# Altium schematic symbol library BARKO_SCHLIB.SchLib: 1064 symbols (part 6 of 11) (continued)
## IC-STM32F072CBT6 (continued)
IC MCU 32BIT 128KB FLASH 48LQFP; Manufacturer: STMicroelectronics; Manufacturer Part Number: STM32F072CBT6TR; Packing: Tray; I/Os (High Current): 37; Core: ARM Cortex-M0; Operating Frequency(F) (Processor speed) (MHz): 48; FLASH Size (Prog) (kB): 128; Internal RAM Size (kB): 16; D/A Converter: 1; Supply Voltage(Vcc) min (V): 2; RAM Size: 16KB; Max Power Dissipation: 370mW; Interface: I2C,SPI,USB,CAN,HDMI,IrDA,UART,USART,LIN,I2S; Number of Timers/Counters: 9; Frequency: 48MHz; Oscillator Type: Internal; Data Bus Width: 32b; Watchdog Timer: Yes; Peripherals: POR,PWM,WDT,DMA; Min Supply Voltage: 2V; Max Supply Voltage: 3.6V; Core Architecture: ARM; Washability: OK; .Creator: M.OZKAN; .PCBCHK: USED; ComponentLink2URL: http://www.st.com/st-web-ui/static/active/en/resource/technical/document/datasheet/DM00090510.pdf; DatasheetVersion: Rev. 5; ComponentLink2Description: Datasheet; Package Reference: LQFP48; PartNumber: STM32F072CBT6; ComponentLink1Description: Manufacturer URL; Package Description: 48-Pin Low Profile Quad Flat Package, Body 7 x 7 mm, Pitch 0.5 mm; ComponentLink1URL: http://www.st.com/; Mounting Technology: Surface Mount; Supplier 1: Digi-Key; Stock 1: 1407; Pricing 1: 1=3.94000, 10=3.53500, 100=2.89650, 500=2.46570, 1000=2.07950 (USD); RoHS: Yes; Mount: Surface Mount; Case/Package: LQFP; Number of Pins: 48; Min Operating Temperature: -40°C; Max Operating Temperature: 85°C; Packaging: Tape and Reel; Number of I/Os: 37; Number of Programmable I/O: 37; Max Frequency: 48MHz; Memory Type: FLASH; Memory Size: 128KB; Package Quantity: 2400; Lead Free: Lead Free; ComponentLink3URL: https://datasheet.ciiva.com/48492/dm00090510-48492505.pdf?src-supplier=Avnet; ComponentLink3Description: https://datasheet.ciiva.com/48492/dm00090510-48492505.pdf?src-supplier=Avnet; Supplier Part Number 1: 497-18747-1-ND; .SCHCHK: USED
footprint STM-LQFP48_M (QFP, 48-Leads, Body 7x7mm, Pitch 0.5mm, IPC Low Density)
pins: 1 VBAT (power) "Backup power supply", 2 PC13-WKUP2, RTC_TAMP1, RTC_TS, RTC_OUT (io) "PC13/WKUP2,RTC_TAMP1,RTC_TS,RTC_OUT", 3 PC14-OSC32_IN(PC14) (io) "PC14-OSC32_IN(PC14)/OSC32_IN", 4 PC15-OSC32_OUT(PC15) (io) "PC15-OSC32_OUT(PC15)/OSC_OUT", 5 PF0-OSC_IN(PF0) (io) "PF0-OSC_IN(PF0)/CRS_SYNC/OSC_IN", 6 PF1-OSC_OUT(PF1) (io) "PF1-OSC_OUT(PF1)/OSC_OUT", 7 NRST (io) "Device reset input/internal reset output(active low)", 8 VSSA (power) "Analog ground", 9 VDDA (power) "Analog power supply", 10 PA0-USART2_CTS, TIM2_CH1_ETR, COMP1_OUT, TSC_G1_IO1, USART4_TX (io) "PA0/USART2_CTS,TIM2_CH1_ETR,COMP1_OUT,TSC_G1_IO1,USART4_TX/RTC_TAMP2,WKUP1,ADC_IN0,COMP1_INM6", 11 PA1-USART2_RTS, TIM2_CH2, TIM15_CH1N, TSC_G1_IO2, USART4_RX, EVENTOUT (io) "PA1/USART2_RTS,TIM2_CH2,TIM15_CH1N,TSC_G1_IO2,USART4_RX,EVENTOUT/ADC_IN1,COMP1_INP", 12 PA2-USART2_TX, COMP2_OUT, TIM2_CH3, TIM15_CH1, TSC_G1_IO3 (io) "PA2/USART2_TX,COMP2_OUT,TIM2_CH3,TIM15_CH1,TSC_G1_IO3/ADC_IN2,COMP2_INM6,WKUP4", 13 PA3-USART2_RX,TIM2_CH4, TIM15_CH2, TSC_G1_IO4 (io) "PA3/USART2_RX,TIM2_CH4,TIM15_CH2,TSC_G1_IO4/ADC_IN3,COMP2_INP", 14 PA4-SPI1_NSS, I2S1_WS, TIM14_CH1, TSC_G2_IO1, USART2_CK (io) "PA4/SPI1_NSS,I2S1_WS,TIM14_CH1,TSC_G2_IO1,USART2_CK/COMP1_INM4,COMP2_INM4,ADC_IN4,DAC_OUT1", 15 PA5-SPI1_SCK, I2S1_CK, CEC, TIM2_CH1_ETR, TSC_G2_IO2 (io) "PA5/SPI1_SCK,I2S1_CK,CEC,TIM2_CH1_ETR,TSC_G2_IO2/COMP1_INM5,COMP2_INM5,ADC_IN5,DAC_OUT2", 16 PA6-SPI1_MISO, I2S1_MCK, TIM3_CH1, TIM1_BKIN, TIM16_CH1, COMP1_OUT, TSC_G2_IO3, EVENTOUT, USART3_CTS (io) "PA6/SPI1_MISO,I2S1_MCK,TIM3_CH1,TIM1_BKIN,TIM16_CH1,COMP1_OUT,TSC_G2_IO3,EVENTOUT,USART3_CTS/ADC_IN6", 17 PA7-SPI1_MOSI, I2S1_SD, TIM3_CH2, TIM14_CH1, TIM1_CH1N, TIM17_CH1, COMP2_OUT, TSC_G2_IO4, EVENTOUT (io) "PA7/SPI1_MOSI,I2S1_SD,TIM3_CH2,TIM14_CH1,TIM1_CH1N,TIM17_CH1,COMP2_OUT,TSC_G2_IO4,EVENTOUT/ADC_IN7", 18 PB0-TIM3_CH3, TIM1_CH2N, TSC_G3_IO2, EVENTOUT, USART3_CK (io) "PB0/TIM3_CH3,TIM1_CH2N,TSC_G3_IO2,EVENTOUT,USART3_CK/ADC_IN8", 19 PB1-TIM3_CH4, USART3_RTS, TIM14_CH1, TIM1_CH3N, TSC_G3_IO3 (io) "PB1/TIM3_CH4,USART3_RTS,TIM14_CH1,TIM1_CH3N,TSC_G3_IO3/ADC_IN9", 20 PB2-TSC_G3_IO4 (io) "PB2/TSC_G3_IO4", 21 PB10-SPI2_SCK, I2C2_SCL, USART3_TX, CEC, TSC_SYNC, TIM2_CH3 (io) "PB10/SPI2_SCK,I2C2_SCL,USART3_TX,CEC,TSC_SYNC,TIM2_CH3", 22 PB11-USART3_RX, TIM2_CH4, EVENTOUT, TSC_G6_IO1, I2C2_SDA (io) "PB11/USART3_RX,TIM2_CH4,EVENTOUT,TSC_G6_IO1,I2C2_SDA", 23 VSS (power) "Ground", 24 VDD (power) "Digital power supply", 25 PB12-TIM1_BKIN, TIM15_BKIN, SPI2_NSS, I2S2_WS, USART3_CK, TSC_G6_IO2, EVENTOUT (io) "PB12/TIM1_BKIN,TIM15_BKIN,SPI2_NSS,I2S2_WS,USART3_CK,TSC_G6_IO2,EVENTOUT", 26 PB13-SPI2_SCK, I2S2_CK, I2C2_SCL, USART3_CTS, TIM1_CH1N, TSC_G6_IO3 (io) "PB13/SPI2_SCK,I2S2_CK,I2C2_SCL,USART3_CTS,TIM1_CH1N,TSC_G6_IO3", 27 PB14-SPI2_MISO, I2S2_MCK, I2C2_SDA, USART3_RTS, TIM1_CH2N, TIM15_CH1, TSC_G6_IO4 (io) "PB14/SPI2_MISO,I2S2_MCK,I2C2_SDA,USART3_RTS,TIM1_CH2N,TIM15_CH1,TSC_G6_IO4", 28 PB15-SPI2_MOSI, I2S2_SD, TIM1_CH3N, TIM15_CH1N, TIM15_CH2 (io) "PB15/SPI2_MOSI,I2S2_SD,TIM1_CH3N,TIM15_CH1N,TIM15_CH2/WKUP7,RTC_REFIN", 29 PA8-USART1_CK, TIM1_CH1, EVENTOUT, MCO, CRS_SYNC (io) "PA8/USART1_CK,TIM1_CH1,EVENTOUT,MCO,CRS_SYNC", 30 PA9-USART1_TX, TIM1_CH2, TIM15_BKIN, TSC_G4_IO1 (io) "PA9/USART1_TX,TIM1_CH2,TIM15_BKIN,TSC_G4_IO1", 31 PA10-USART1_RX, TIM1_CH3, TIM17_BKIN, TSC_G4_IO2 (io) "PA10/USART1_RX,TIM1_CH3,TIM17_BKIN,TSC_G4_IO2", 32 PA11-CAN_RX, USART1_CTS, TIM1_CH4, COMP1_OUT, TSC_G4_IO3, EVENTOUT (io) "PA11/CAN_RX,USART1_CTS,TIM1_CH4,COMP1_OUT,TSC_G4_IO3,EVENTOUT/USB_DM", 33 PA12-CAN_TX, USART1_RTS, TIM1_ETR, COMP2_OUT, TSC_G4_IO4, EVENTOUT (io) "PA12/CAN_TX,USART1_RTS,TIM1_ETR,COMP2_OUT,TSC_G4_IO4,EVENTOUT/USB_DP", 34 PA13-IR_OUT, SWDIO, USB_NOE (io) "PA13/IR_OUT,SWDIO,USB_NOE", 35 VSS (power) "Ground", 36 VDDIO2 (power) "Digital power supply", 37 PA14-USART2_TX, SWCLK (io) "PA14/USART2_TX,SWCLK", 38 PA15-SPI1_NSS, I2S1_WS, USART2_RX, USART4_RTS, TIM2_CH1_ETR, EVENTOUT (io) "PA15/SPI1_NSS,I2S1_WS,USART2_RX,USART4_RTS,TIM2_CH1_ETR,EVENTOUT", 39 PB3-SPI1_SCK, I2S1_CK, TIM2_CH2, TSC_G5_IO1, EVENTOUT (io) "PB3/SPI1_SCK,I2S1_CK,TIM2_CH2,TSC_G5_IO1,EVENTOUT", 40 PB4-SPI1_MISO, I2S1_MCK, TIM17_BKIN, TIM3_CH1, TSC_G5_IO2, EVENTOUT  (io) "PB4/SPI1_MISO,I2S1_MCK,TIM17_BKIN,TIM3_CH1,TSC_G5_IO2,EVENTOUT", 41 PB5-SPI1_MOSI, I2S1_SD, I2C1_SMBA, TIM16_BKIN, TIM3_CH2  (io) "PB5/SPI1_MOSI,I2S1_SD,I2C1_SMBA,TIM16_BKIN,TIM3_CH2/WKUP6", 42 PB6-I2C1_SCL, USART1_TX, TIM16_CH1N, TSC_G5_I03 (io) "PB6/I2C1_SCL,USART1_TX,TIM16_CH1N,TSC_G5_IO3", 43 PB7-I2C1_SDA, USART1_RX, USART4_CTS, TIM17_CH1N, TSC_G5_IO4 (io) "PB7/I2C1_SDA,USART1_RX,USART4_CTS,TIM17_CH1N,TSC_G5_IO4", 44 BOOT0 (in) "Boot memory selection", 45 PB8-I2C1_SCL, CEC, TIM16_CH1, TSC_SYNC, CAN_RX (io) "PB8/I2C1_SCL,CEC,TIM16_CH1,TSC_SYNC,CAN_RX", 46 PB9-SPI2_NSS, I2S2_WS, I2C1_SDA, IR_OUT, TIM17_CH1, EVENTOUT, CAN_TX (io) "PB9/SPI2_NSS,I2S2_WS,I2C1_SDA,IR_OUT,TIM17_CH1,EVENTOUT,CAN_TX", 47 VSS (power) "Ground", 48 VDD (power) "Digital power supply"

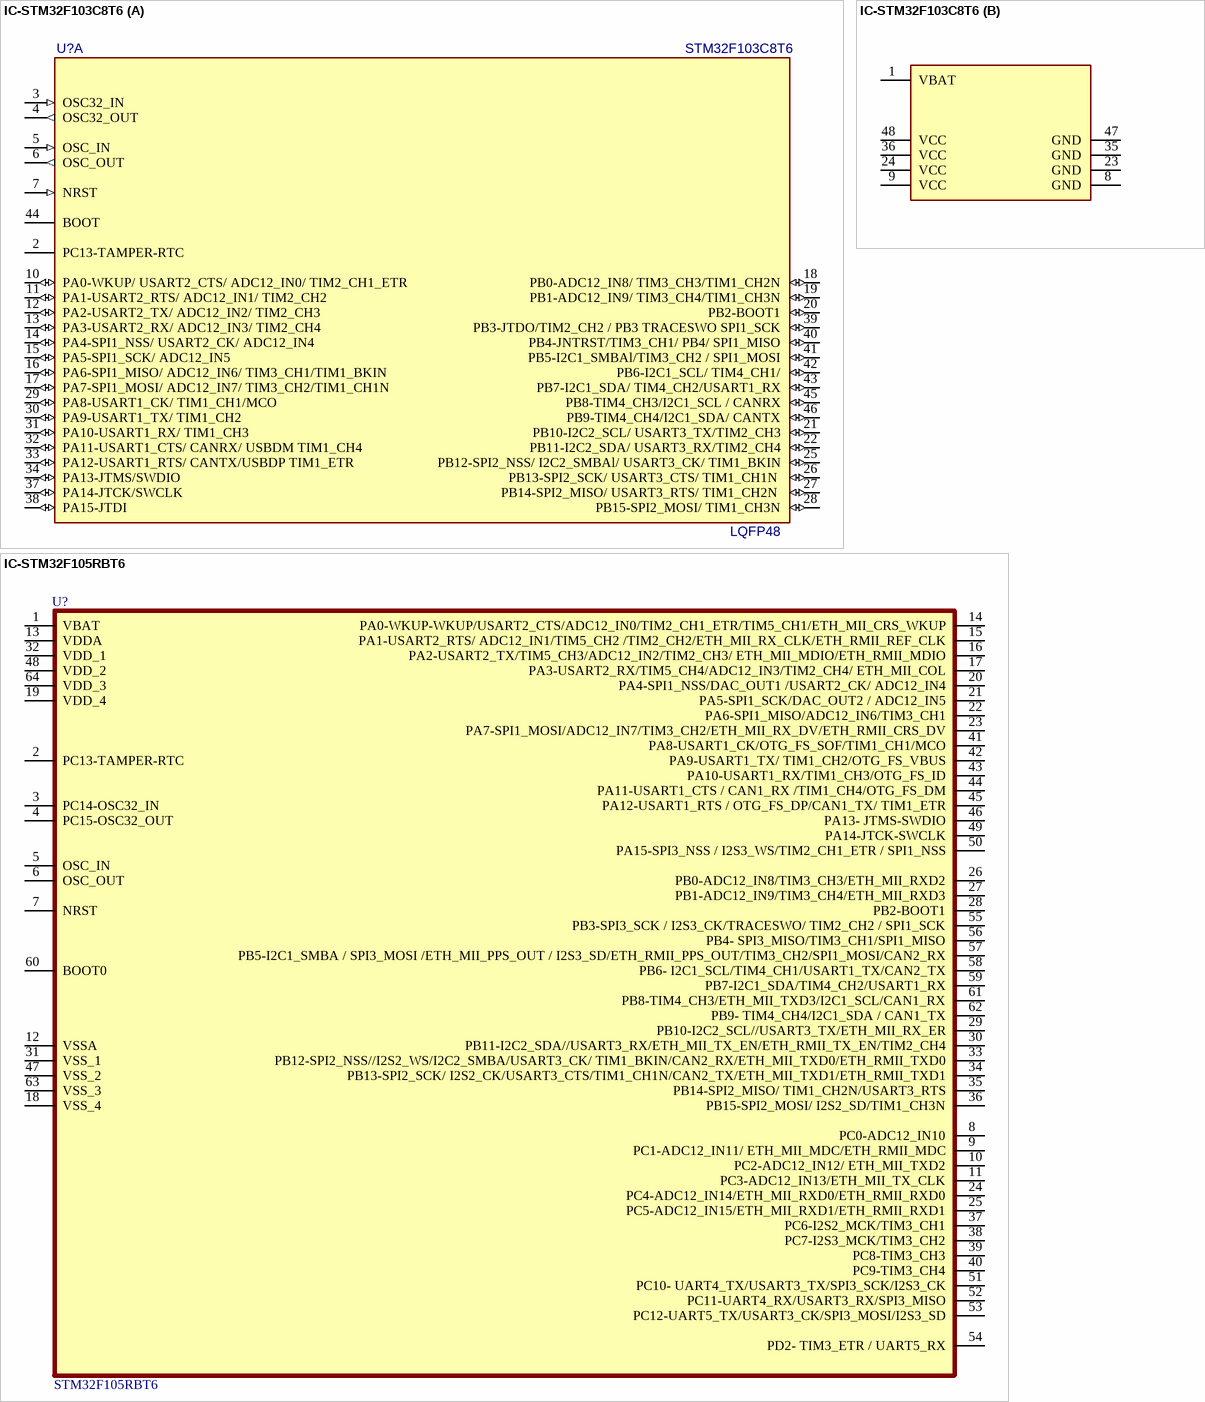
[diagram p23: symbols IC-STM32F103C8T6 to IC-STM32F105RBT6]

## IC-STM32F103C8T6
designator U?, comment STM32F103C8T6  Case/Package: LQFP48
IC MCU 32BIT 64KB FLASH 48LQFP; Manufacturer: STMicroelectronics; RAM Size: 20KB; Frequency: 72MHz; Number of Timers/Counters: 4; Number of ADC Channels: 10; Data Bus Width: 32b; Number of Bits: 32; Core Architecture: ARM; Max Power Dissipation: 363mW; Interface: CAN,I2C,IrDA,LIN,SPI,UART,USART,USB; Number of I/Os: 37; Max Supply Voltage: 3.6V; Min Supply Voltage: 2V; Oscillator Type: Internal; Number of Programmable I/O: 48; Number of SPI Channels: 2; Watchdog Timer: Yes; Peripherals: DMA,I2C,POR,PWM,Temp Sensor,WDT; Number of PWM Channels: 1; .PCBCHK: USED; .Creator: F:TALI; Washability: OK; Supplier 1: Digi-Key; Manufacturer Part Number: STM32F103C8T6; Stock 1: 3996; Pricing 1: 1=6.06, 10=5.438, 250=4.22724, 500=3.7931, 1000=3.199 (USD); Number of Pins: 48; Min Operating Temperature: -40°C; Max Operating Temperature: 85°C; Packaging: Tray; Density: 64KB; Memory Type: FLASH; Max Frequency: 72MHz; Memory Size: 64KB; Package Quantity: 250; Number of I2C Channels: 2; Termination: SMD/SMT; Address Bus Width: 32b; Length: 7mm; Height: 1.45mm; Width: 7.2mm; Radiation Hardening: No; Lead Free: Lead Free; REACH SVHC: No SVHC; ComponentLink1URL: http://www.st.com/web/en/resource/technical/document/datasheet/CD00161566.pdf; ComponentLink1Description: http://www.st.com/web/en/resource/technical/document/datasheet/CD00161566.pdf; ComponentLink2URL: https://www.distrelec.biz/Web/Downloads/3_/en/puSTM_ARM-MicroCont-STM32F103_EN.pdf?mime=application%2Fpdf; ComponentLink2Description: https://www.distrelec.biz/Web/Downloads/3_/en/puSTM_ARM-MicroCont-STM32F103_EN.pdf?mime=application%2Fpdf; ComponentLink3URL: https://www.verical.com/server-webapp/html/getDatasheet?partID=69880; ComponentLink3Description: https://www.verical.com/server-webapp/html/getDatasheet?partID=69880; ComponentLink4URL: http://www.farnell.com/datasheets/1730126.pdf; ComponentLink4Description: http://www.farnell.com/datasheets/1730126.pdf; ComponentLink5URL: http://www.produktinfo.conrad.com/datenblaetter/1000000-1099999/001075658-da-01-en-MCU_64KB_MEM_STM32F103C8T6_LQFP_48_STM.pdf; ComponentLink5Description: http://www.produktinfo.conrad.com/datenblaetter/1000000-1099999/001075658-da-01-en-MCU_64KB_MEM_STM32F103C8T6_LQFP_48_STM.pdf; ComponentLink6URL: http://datasheet.iiic.cc/stmicroelectronics/STM32F103C8T6.pdf; ComponentLink6Description: http://datasheet.iiic.cc/stmicroelectronics/STM32F103C8T6.pdf; Supplier Part Number 1: 497-6063-ND; .SCHCHK: USED
footprint LQFP_48
footprint STM-LQFP48_M (QFP, 48-Leads, Body 7x7mm, Pitch 0.5mm, IPC Low Density)
part A pins: 2 PC13-TAMPER-RTC, 3 OSC32_IN (in), 4 OSC32_OUT (out), 5 OSC_IN (in), 6 OSC_OUT (out), 7 NRST (in), 10 PA0-WKUP/ USART2_CTS/ ADC12_IN0/ TIM2_CH1_ETR (io), 11 PA1-USART2_RTS/ ADC12_IN1/ TIM2_CH2 (io), 12 PA2-USART2_TX/ ADC12_IN2/ TIM2_CH3 (io), 13 PA3-USART2_RX/ ADC12_IN3/ TIM2_CH4 (io), 14 PA4-SPI1_NSS/ USART2_CK/ ADC12_IN4  (io), 15 PA5-SPI1_SCK/ ADC12_IN5  (io), 16 PA6-SPI1_MISO/ ADC12_IN6/ TIM3_CH1/TIM1_BKIN (io), 17 PA7-SPI1_MOSI/ ADC12_IN7/ TIM3_CH2/TIM1_CH1N (io), 18 PB0-ADC12_IN8/ TIM3_CH3/TIM1_CH2N (io), 19 PB1-ADC12_IN9/ TIM3_CH4/TIM1_CH3N (io), 20 PB2-BOOT1 (io), 21 PB10-I2C2_SCL/ USART3_TX/TIM2_CH3 (io), 22 PB11-I2C2_SDA/ USART3_RX/TIM2_CH4 (io), 25 PB12-SPI2_NSS/ I2C2_SMBAl/ USART3_CK/ TIM1_BKIN (io), 26 PB13-SPI2_SCK/ USART3_CTS/ TIM1_CH1N  (io), 27 PB14-SPI2_MISO/ USART3_RTS/ TIM1_CH2N  (io), 28 PB15-SPI2_MOSI/ TIM1_CH3N (io), 29 PA8-USART1_CK/ TIM1_CH1/MCO (io), 30 PA9-USART1_TX/ TIM1_CH2 (io), 31 PA10-USART1_RX/ TIM1_CH3 (io), 32 PA11-USART1_CTS/ CANRX/ USBDM TIM1_CH4 (io), 33 PA12-USART1_RTS/ CANTX/USBDP TIM1_ETR (io), 34 PA13-JTMS/SWDIO  (io), 37 PA14-JTCK/SWCLK  (io), 38 PA15-JTDI (io), 39 PB3-JTDO/TIM2_CH2 / PB3 TRACESWO SPI1_SCK (io), 40 PB4-JNTRST/TIM3_CH1/ PB4/ SPI1_MISO (io), 41 PB5-I2C1_SMBAl/TIM3_CH2 / SPI1_MOSI (io), 42 PB6-I2C1_SCL/ TIM4_CH1/ (io), 43 PB7-I2C1_SDA/ TIM4_CH2/USART1_RX (io), 44 BOOT, 45 PB8-TIM4_CH3/I2C1_SCL / CANRX (io), 46 PB9-TIM4_CH4/I2C1_SDA/ CANTX (io)
part B pins: 1 VBAT, 8 GND (power), 9 VCC (power), 23 GND (power), 24 VCC (power), 35 GND (power), 36 VCC (power), 47 GND (power), 48 VCC (power)

## IC-STM32F105RBT6
designator U?, comment STM32F105RBT6
IC MCU 32BIT 128KB FLASH 64LQFP; Manufacturer: STMicroelectronics; Interface: CAN,I2C,I2S,IrDA,LIN,SPI,UART,USART,USB; Number of Timers/Counters: 7; Frequency: 72MHz; RAM Size: 32KB; Max Supply Voltage: 3.6V; Number of I/Os: 51; Max Power Dissipation: 444mW; Min Supply Voltage: 2V; Data Bus Width: 32b; Oscillator Type: Internal; Watchdog Timer: Yes; Peripherals: DMA,I2C,POR,PWM,Voltage Detect,WDT; Core Architecture: ARM; Number of PWM Channels: 16; Number of SPI Channels: 3; Number of I2C Channels: 2; .Creator: F:TALI; .PCBCHK: USED; Washability: OK; Supplier 1: Digi-Key; Manufacturer Part Number: STM32F105RBT6; Stock 1: 7453; Pricing 1: 1=7.14, 10=6.45, 160=5.34, 640=4.65, 1120=4.05 (USD); Number of Pins: 64; Min Operating Temperature: -40°C; Max Operating Temperature: 85°C; Package Quantity: 160; Packaging: Tray; Number of Programmable I/O: 51; Max Frequency: 72MHz; Memory Type: FLASH; Memory Size: 128KB; Number of ADC Channels: 16; Density: 128KB; Termination: SMD/SMT; Length: 10mm; Height: 1.45mm; Width: 10mm; Radiation Hardening: No; Lead Free: Lead Free; REACH SVHC: No SVHC; ComponentLink1URL: http://www.farnell.com/datasheets/1805458.pdf?src-supplier=Element14; ComponentLink1Description: http://www.farnell.com/datasheets/1805458.pdf?src-supplier=Element14; ComponentLink2URL: https://www.verical.com/server-webapp/html/getDatasheet?partID=113902&src-supplier=Verical; ComponentLink2Description: https://www.verical.com/server-webapp/html/getDatasheet?partID=113902&src-supplier=Verical; ComponentLink3URL: http://www.produktinfo.conrad.com/datenblaetter/1000000-1099999/001075692-da-01-en-MCU_128KB_MEM_STM32F105RBT6_LQFP_64_STM.pdf?src-supplier=Conrad; ComponentLink3Description: http://www.produktinfo.conrad.com/datenblaetter/1000000-1099999/001075692-da-01-en-MCU_128KB_MEM_STM32F105RBT6_LQFP_64_STM.pdf?src-supplier=Conrad; ComponentLink4URL: http://datasheet.iiic.cc/stmicroelectronics/STM32F105RBT6.pdf?src-supplier=IIIC; ComponentLink4Description: http://datasheet.iiic.cc/stmicroelectronics/STM32F105RBT6.pdf?src-supplier=IIIC; Supplier Part Number 1: 497-8920-ND; .SCHCHK: USED; Case/Package: LQFP64
footprint STM-LQFP64_V (Thin QFP, 64-Leads, Body 10x10mm, Pitch 0.5mm, ST Recommended)
pins: 1 VBAT, 2 PC13-TAMPER-RTC, 3 PC14-OSC32_IN, 4 PC15-OSC32_OUT, 5 OSC_IN, 6 OSC_OUT, 7 NRST, 8 PC0-ADC12_IN10, 9 PC1-ADC12_IN11/ ETH_MII_MDC/ETH_RMII_MDC, 10 PC2-ADC12_IN12/ ETH_MII_TXD2, 11 PC3-ADC12_IN13/ETH_MII_TX_CLK, 12 VSSA, 13 VDDA, 14 PA0-WKUP-WKUP/USART2_CTS/ADC12_IN0/TIM2_CH1_ETR/TIM5_CH1/ETH_MII_CRS_WKUP, 15 PA1-USART2_RTS/ ADC12_IN1/TIM5_CH2 /TIM2_CH2/ETH_MII_RX_CLK/ETH_RMII_REF_CLK, 16 PA2-USART2_TX/TIM5_CH3/ADC12_IN2/TIM2_CH3/ ETH_MII_MDIO/ETH_RMII_MDIO, 17 PA3-USART2_RX/TIM5_CH4/ADC12_IN3/TIM2_CH4/ ETH_MII_COL, 18 VSS_4, 19 VDD_4, 20 PA4-SPI1_NSS/DAC_OUT1 /USART2_CK/ ADC12_IN4, 21 PA5-SPI1_SCK/DAC_OUT2 / ADC12_IN5, 22 PA6-SPI1_MISO/ADC12_IN6/TIM3_CH1, 23 PA7-SPI1_MOSI/ADC12_IN7/TIM3_CH2/ETH_MII_RX_DV/ETH_RMII_CRS_DV, 24 PC4-ADC12_IN14/ETH_MII_RXD0/ETH_RMII_RXD0, 25 PC5-ADC12_IN15/ETH_MII_RXD1/ETH_RMII_RXD1, 26 PB0-ADC12_IN8/TIM3_CH3/ETH_MII_RXD2, 27 PB1-ADC12_IN9/TIM3_CH4/ETH_MII_RXD3, 28 PB2-BOOT1, 29 PB10-I2C2_SCL//USART3_TX/ETH_MII_RX_ER, 30 PB11-I2C2_SDA//USART3_RX/ETH_MII_TX_EN/ETH_RMII_TX_EN/TIM2_CH4, 31 VSS_1, 32 VDD_1, 33 PB12-SPI2_NSS//I2S2_WS/I2C2_SMBA/USART3_CK/ TIM1_BKIN/CAN2_RX/ETH_MII_TXD0/ETH_RMII_TXD0, 34 PB13-SPI2_SCK/ I2S2_CK/USART3_CTS/TIM1_CH1N/CAN2_TX/ETH_MII_TXD1/ETH_RMII_TXD1, 35 PB14-SPI2_MISO/ TIM1_CH2N/USART3_RTS, 36 PB15-SPI2_MOSI/ I2S2_SD/TIM1_CH3N, 37 PC6-I2S2_MCK/TIM3_CH1, 38 PC7-I2S3_MCK/TIM3_CH2, 39 PC8-TIM3_CH3, 40 PC9-TIM3_CH4, 41 PA8-USART1_CK/OTG_FS_SOF/TIM1_CH1/MCO, 42 PA9-USART1_TX/ TIM1_CH2/OTG_FS_VBUS, 43 PA10-USART1_RX/TIM1_CH3/OTG_FS_ID, 44 PA11-USART1_CTS / CAN1_RX /TIM1_CH4/OTG_FS_DM, 45 PA12-USART1_RTS / OTG_FS_DP/CAN1_TX/ TIM1_ETR, 46 PA13- JTMS-SWDIO, 47 VSS_2, 48 VDD_2, 49 PA14-JTCK-SWCLK, 50 PA15-SPI3_NSS / I2S3_WS/TIM2_CH1_ETR / SPI1_NSS, 51 PC10- UART4_TX/USART3_TX/SPI3_SCK/I2S3_CK, 52 PC11-UART4_RX/USART3_RX/SPI3_MISO, 53 PC12-UART5_TX/USART3_CK/SPI3_MOSI/I2S3_SD, 54 PD2- TIM3_ETR / UART5_RX, 55 PB3-SPI3_SCK / I2S3_CK/TRACESWO/ TIM2_CH2 / SPI1_SCK, 56 PB4- SPI3_MISO/TIM3_CH1/SPI1_MISO, 57 PB5-I2C1_SMBA / SPI3_MOSI /ETH_MII_PPS_OUT / I2S3_SD/ETH_RMII_PPS_OUT/TIM3_CH2/SPI1_MOSI/CAN2_RX, 58 PB6- I2C1_SCL/TIM4_CH1/USART1_TX/CAN2_TX, 59 PB7-I2C1_SDA/TIM4_CH2/USART1_RX, 60 BOOT0, 61 PB8-TIM4_CH3/ETH_MII_TXD3/I2C1_SCL/CAN1_RX, 62 PB9- TIM4_CH4/I2C1_SDA / CAN1_TX, 63 VSS_3, 64 VDD_3

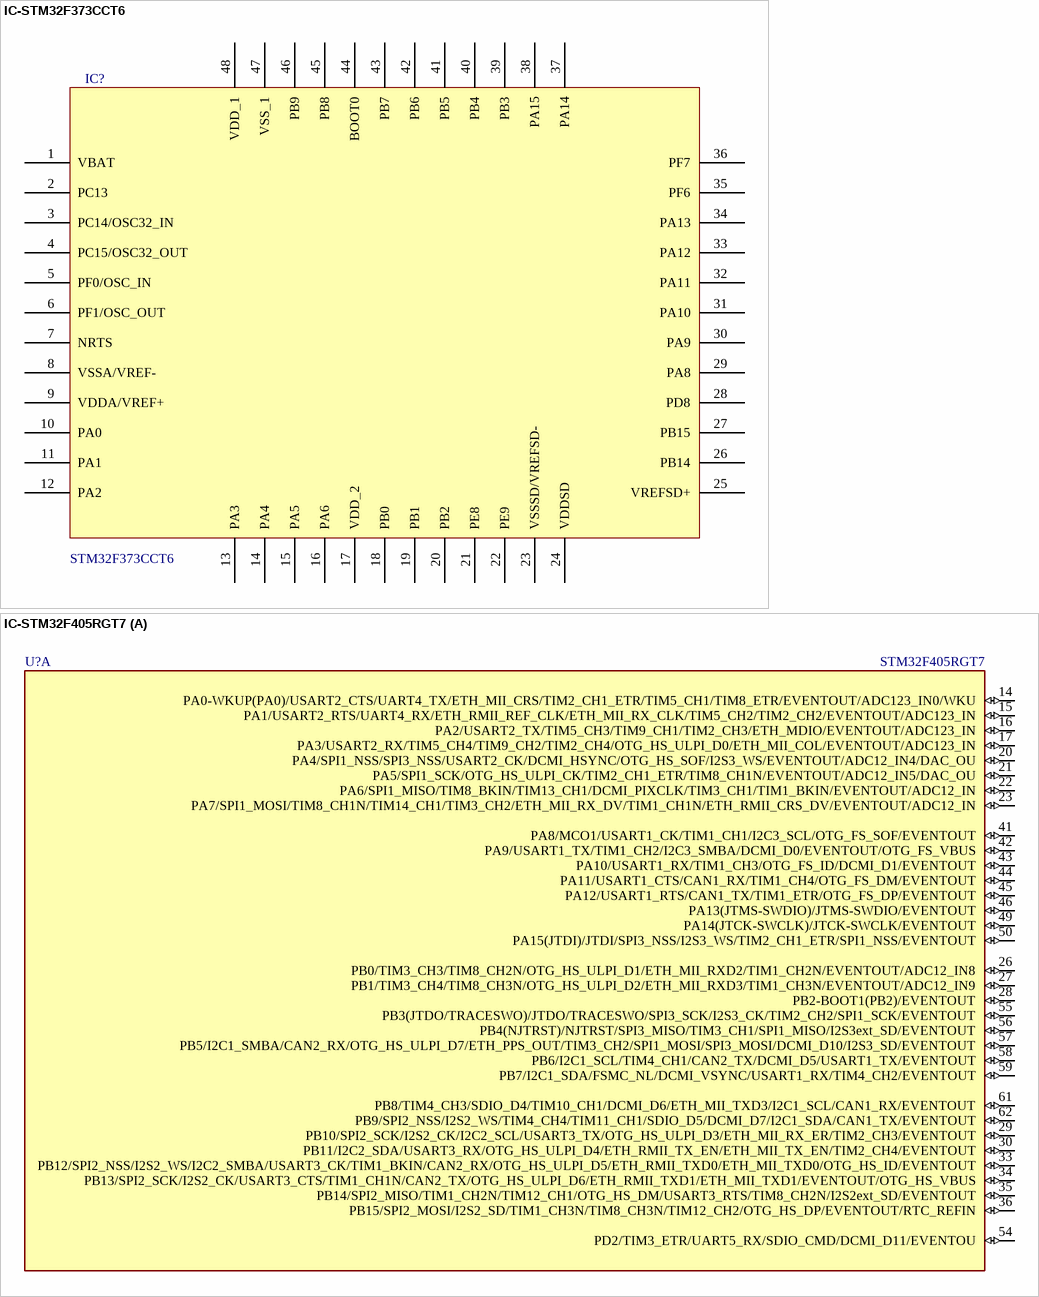
[diagram p24: symbols IC-STM32F373CCT6 to IC-STM32F405RGT7]

## IC-STM32F373CCT6
designator IC?, comment STM32F373CCT6